# Altium footprint library PcbLib1.PcbLib: 209 footprints (part 1 of 14)
Each footprint in its own frame and in the unit in brackets; x right, y up, seen from the top. Pads: shape width x height; smd on the part's side, far side on the other; paste and mask are expansions set on the pad; w line width, h text height; cw(c..) or ccw(c..) is an arc to the next point about the centre after c.
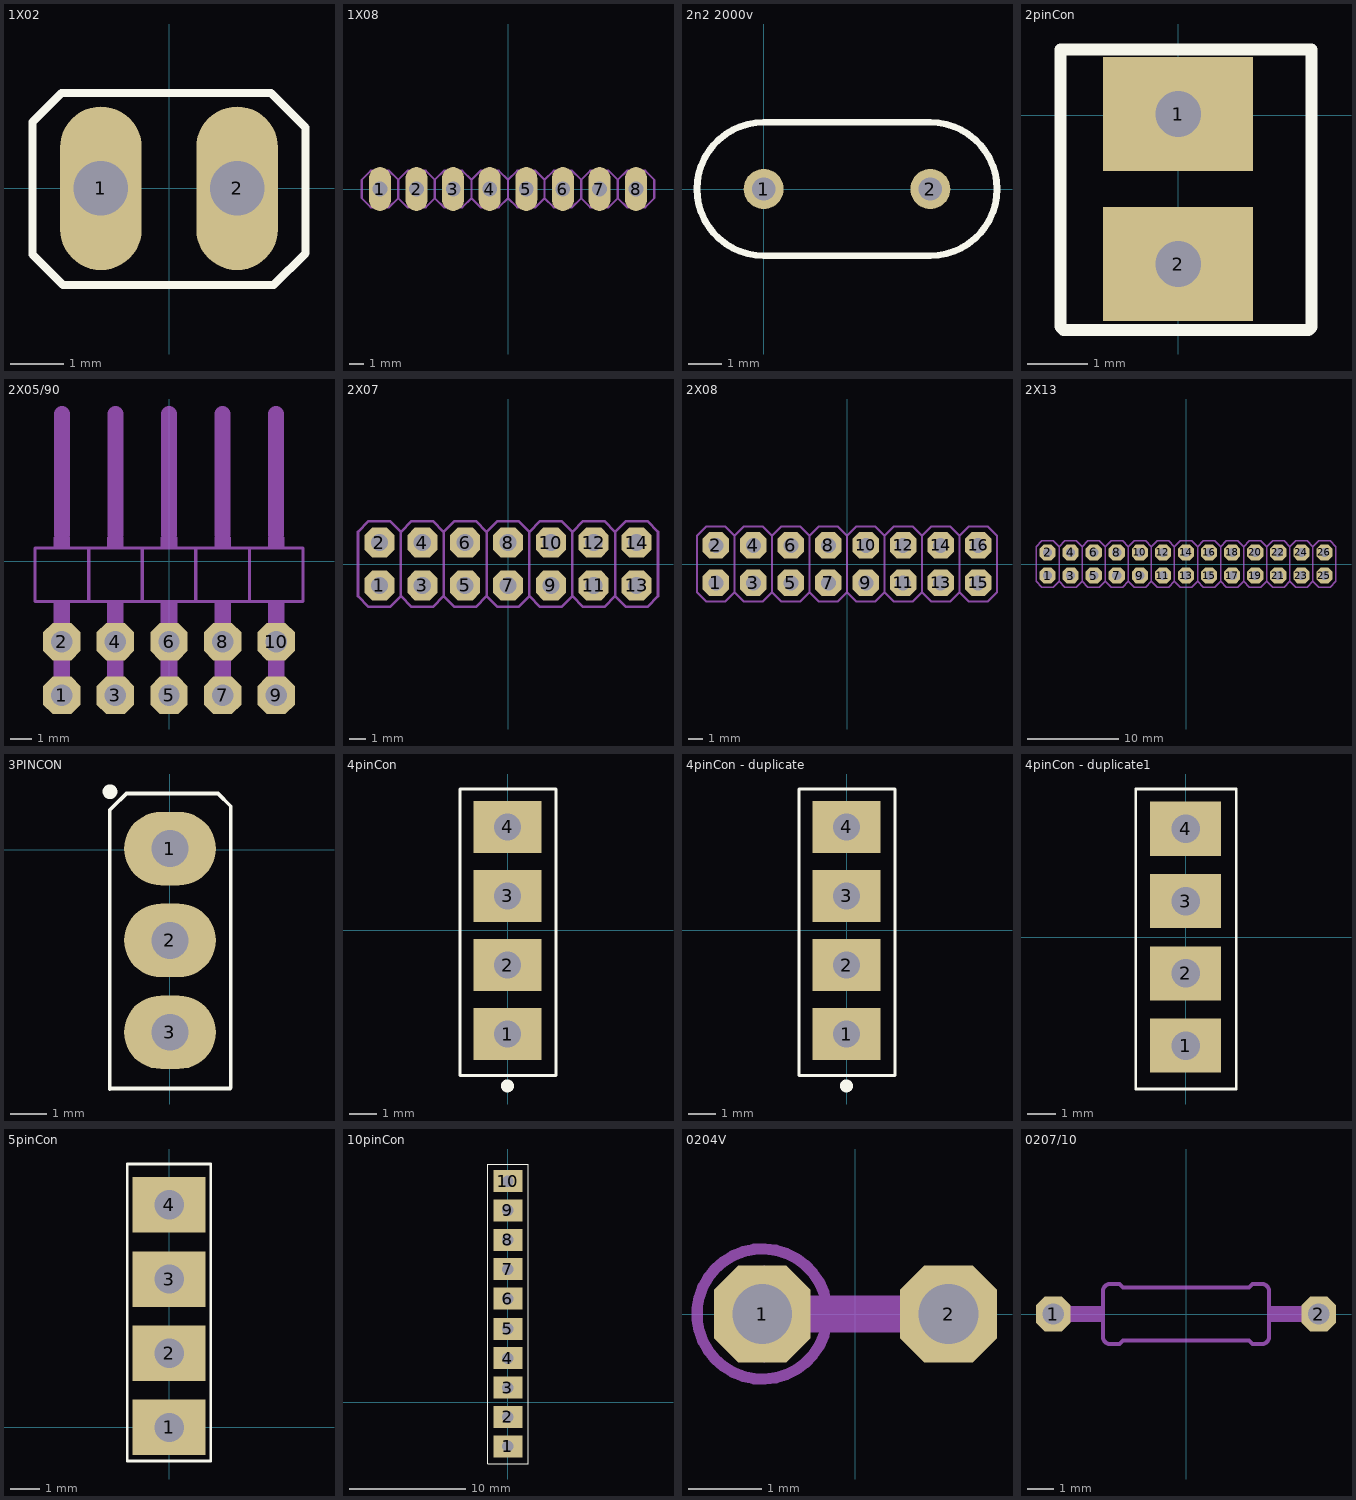
[diagram p0: the footprints below, top view; thin cyan lines are the x and y axes]

## 1X02 [mil] "1X02"
pads (2):
  oval 60x120 / inner round 0 / far side oval 60x120 hole 40: 1(-50,0) 2(50,0)
Top Overlay:
  lines w6: -100,-48.62 -100,48.62 -78.74,69.88 74.8,69.88 100,44.69 100,-47.64 76.77,-70.87 -65.94,-70.87 -77.76,-70.87 -100,-48.62
Bottom Assembly:
  region: -60,-10 -60,10 -40,10 -40,-10
  region: 40,-10 40,10 60,10 60,-10
3D body: height 150, standoff 0, extent -60,-10 -40,10
3D body: height 150, standoff 0, extent 40,-10 60,10
3D body: height 50, standoff 0, extent -80.26,-60.26 -19.74,60.26
3D body: height 50, standoff 0, extent 19.74,-60.26 80.26,60.26

## 1X08 [mil] "1X08"
pads (8):
  oval 60x120 / inner round 0 / far side oval 60x120 hole 40: 1(-350,0) 2(-250,0) 3(-150,0) 4(-50,0) 5(50,0) 6(150,0) 7(250,0) 8(350,0)
Bottom Assembly:
  region: 340,-10 340,10 360,10 360,-10
  region: -360,-10 -360,10 -340,10 -340,-10
  region: -260,-10 -260,10 -240,10 -240,-10
  region: -160,-10 -160,10 -140,10 -140,-10
  region: -60,-10 -60,10 -40,10 -40,-10
  region: 40,-10 40,10 60,10 60,-10
  region: 140,-10 140,10 160,10 160,-10
  region: 240,-10 240,10 260,10 260,-10
Bottom 3D Body:
  lines w6: -300,-25 -275,-50 -225,-50 -200,-25 ; -300,-25 -325,-50 -375,-50 -400,-25 -400,25 -375,50 -325,50 -300,25 ; -300,-25 -300,25 ; -300,25 -275,50 -225,50 -200,25 ; -200,-25 -200,25 ; -200,-25 -175,-50 -125,-50 -100,-25 ; -200,25 -175,50 -125,50 -100,25 ; -100,-25 -75,-50 -25,-50 0,-25 ; -100,-25 -100,25 ; -100,25 -75,50 -25,50 0,25 ; 0,-25 25,-50 75,-50 100,-25 ; 0,-25 0,25 ; 0,25 25,50 75,50 100,25 ; 100,-25 100,25 ; 100,-25 125,-50 175,-50 200,-25 ; 100,25 125,50 175,50 200,25 ; 200,-25 225,-50 275,-50 300,-25 ; 200,-25 200,25 ; 200,25 225,50 275,50 300,25 ; 300,-25 325,-50 375,-50 400,-25 400,25 375,50 325,50 300,25 ; 300,-25 300,25
3D body: height 50, standoff 0, extent 319.74,-60.26 380.26,60.26
3D body: height 50, standoff 0, extent 219.74,-60.26 280.26,60.26
3D body: height 50, standoff 0, extent 119.74,-60.26 180.26,60.26
3D body: height 50, standoff 0, extent 19.74,-60.26 80.26,60.26
3D body: height 50, standoff 0, extent -80.26,-60.26 -19.74,60.26
3D body: height 50, standoff 0, extent -180.26,-60.26 -119.74,60.26
3D body: height 50, standoff 0, extent -280.26,-60.26 -219.74,60.26
3D body: height 50, standoff 0, extent -380.26,-60.26 -319.74,60.26
3D body: height 150, standoff 0, extent 340,-10 360,10
3D body: height 150, standoff 0, extent -360,-10 -340,10
3D body: height 150, standoff 0, extent -260,-10 -240,10
3D body: height 150, standoff 0, extent -160,-10 -140,10
3D body: height 150, standoff 0, extent -60,-10 -40,10
3D body: height 150, standoff 0, extent 40,-10 60,10
3D body: height 150, standoff 0, extent 140,-10 160,10
3D body: height 150, standoff 0, extent 240,-10 260,10

## 2n2 2000v [mm]
pads (2):
  round 1.2 hole 0.7: 1(0,0) 2(5,0)
Top Overlay:
  lines w0.2: 0,-2 cw(c0,0) 0,2 5,2 cw(c5,0) 5,-2 0,-2
3D body "User Library-TDK_CAP_CK45_.STEP": height 12.5, standoff -5, extent -3.046,-2.475 7.947,2.525

## 2pinCon [mm]
pads (2):
  rect 2.5x1.9 hole 0.762 square: 1(0,0.025) 2(0,-2.475)
Top Overlay:
  lines w0.2: -1.965,-3.52 -1.91,-3.575 2.175,-3.575 2.225,-3.525 2.225,1.1 -1.965,1.1 -1.965,-3.52
3D body "User Library-Molex - 2-Pin Header with Lock (0_100in pitch).STEP": height 10.68, standoff -3.54, extent -3.302,-3.81 3.048,1.27

## 2X05/90 [mil] "2X05/90"
pads (10):
  oct 70x70 / inner round 0 / far side oct 70x70 hole 40: 1(-200,-250) 2(-200,-150) 3(-100,-250) 4(-100,-150) 5(0,-250) 6(0,-150) 7(100,-250) 8(100,-150) 9(200,-250) 10(200,-150)
Bottom Assembly:
  region: -215,-185 -215,-115 -185,-115 -185,-185
  region: -115,-185 -115,-115 -85,-115 -85,-185
  region: -15,-185 -15,-115 15,-115 15,-185
  region: 85,-185 85,-115 115,-115 115,-185
  region: 185,-185 185,-115 215,-115 215,-185
Bottom 3D Body:
  region: -215,25 -215,45 -185,45 -185,25
  region: -115,25 -115,45 -85,45 -85,25
  region: -15,25 -15,45 15,45 15,25
  region: 85,25 85,45 115,45 115,25
  region: 185,25 185,45 215,45 215,25
  region: -215,-115 -215,-75 -185,-75 -185,-115
  region: -115,-115 -115,-75 -85,-75 -85,-115
  region: -215,-215 -215,-185 -185,-185 -185,-215
  region: -115,-215 -115,-185 -85,-185 -85,-215
  region: -15,-115 -15,-75 15,-75 15,-115
  region: 85,-115 85,-75 115,-75 115,-115
  region: -15,-215 -15,-185 15,-185 15,-215
  region: 85,-215 85,-185 115,-185 115,-215
  region: 185,-115 185,-75 215,-75 215,-115
  region: 185,-215 185,-185 215,-185 215,-215
  lines w6: -150,-75 -250,-75 -250,25 -150,25 ; -150,-75 -150,25 ; -150,-75 -50,-75 ; -150,25 -50,25 ; -50,-75 -50,25 ; -50,-75 50,-75 ; -50,25 50,25 ; 50,-75 50,25 ; 50,-75 150,-75 ; 50,25 150,25 ; 150,-75 150,25 ; 150,-75 250,-75 250,25 150,25
  lines w30: -200,50 -200,275 ; -100,50 -100,275 ; 0,50 0,275 ; 100,50 100,275 ; 200,50 200,275

## 2X07 [mil] "2X07"
pads (14):
  oct 70x70 / inner round 0 / far side oct 70x70 hole 40: 1(-300,-50) 2(-300,50) 3(-200,-50) 4(-200,50) 5(-100,-50) 6(-100,50) 7(0,-50) 8(0,50) 9(100,-50) 10(100,50) 11(200,-50) 12(200,50) 13(300,-50) 14(300,50)
Bottom Assembly:
  region: -310,-60 -310,-40 -290,-40 -290,-60
  region: -310,40 -310,60 -290,60 -290,40
  region: -210,40 -210,60 -190,60 -190,40
  region: -210,-60 -210,-40 -190,-40 -190,-60
  region: -110,40 -110,60 -90,60 -90,40
  region: -110,-60 -110,-40 -90,-40 -90,-60
  region: -10,40 -10,60 10,60 10,40
  region: 90,40 90,60 110,60 110,40
  region: 190,40 190,60 210,60 210,40
  region: -10,-60 -10,-40 10,-40 10,-60
  region: 90,-60 90,-40 110,-40 110,-60
  region: 190,-60 190,-40 210,-40 210,-60
  region: 290,40 290,60 310,60 310,40
  region: 290,-60 290,-40 310,-40 310,-60
Bottom 3D Body:
  lines w6: -250,-75 -275,-100 -325,-100 -350,-75 -350,75 -325,100 -275,100 -250,75 ; -250,-75 -225,-100 -175,-100 -150,-75 ; -250,-75 -250,75 ; -250,75 -225,100 -175,100 -150,75 ; -150,-75 -125,-100 -75,-100 -50,-75 ; -150,-75 -150,75 ; -150,75 -125,100 -75,100 -50,75 ; -50,-75 -25,-100 25,-100 50,-75 ; -50,-75 -50,75 ; -50,75 -25,100 25,100 50,75 ; 50,-75 75,-100 125,-100 150,-75 ; 50,-75 50,75 ; 50,75 75,100 125,100 150,75 ; 150,-75 175,-100 225,-100 250,-75 ; 150,-75 150,75 ; 150,75 175,100 225,100 250,75 ; 250,-75 250,75 ; 250,-75 275,-100 325,-100 350,-75 350,75 325,100 275,100 250,75

## 2X08 [mil] "2X08"
pads (16):
  oct 70x70 / inner round 0 / far side oct 70x70 hole 40: 1(-350,-50) 2(-350,50) 3(-250,-50) 4(-250,50) 5(-150,-50) 6(-150,50) 7(-50,-50) 8(-50,50) 9(50,-50) 10(50,50) 11(150,-50) 12(150,50) 13(250,-50) 14(250,50) 15(350,-50) 16(350,50)
Bottom Assembly:
  region: -360,-60 -360,-40 -340,-40 -340,-60
  region: -360,40 -360,60 -340,60 -340,40
  region: -260,40 -260,60 -240,60 -240,40
  region: -260,-60 -260,-40 -240,-40 -240,-60
  region: -160,40 -160,60 -140,60 -140,40
  region: -160,-60 -160,-40 -140,-40 -140,-60
  region: -60,40 -60,60 -40,60 -40,40
  region: 40,40 40,60 60,60 60,40
  region: 140,40 140,60 160,60 160,40
  region: -60,-60 -60,-40 -40,-40 -40,-60
  region: 40,-60 40,-40 60,-40 60,-60
  region: 140,-60 140,-40 160,-40 160,-60
  region: 240,40 240,60 260,60 260,40
  region: 240,-60 240,-40 260,-40 260,-60
  region: 340,40 340,60 360,60 360,40
  region: 340,-60 340,-40 360,-40 360,-60
Bottom 3D Body:
  lines w6: -300,-75 -325,-100 -375,-100 -400,-75 -400,75 -375,100 -325,100 -300,75 ; -300,-75 -275,-100 -225,-100 -200,-75 ; -300,-75 -300,75 ; -300,75 -275,100 -225,100 -200,75 ; -200,-75 -175,-100 -125,-100 -100,-75 ; -200,-75 -200,75 ; -200,75 -175,100 -125,100 -100,75 ; -100,-75 -75,-100 -25,-100 0,-75 ; -100,-75 -100,75 ; -100,75 -75,100 -25,100 0,75 ; 0,-75 25,-100 75,-100 100,-75 ; 0,-75 0,75 ; 0,75 25,100 75,100 100,75 ; 100,-75 125,-100 175,-100 200,-75 ; 100,-75 100,75 ; 100,75 125,100 175,100 200,75 ; 200,-75 225,-100 275,-100 300,-75 ; 200,-75 200,75 ; 200,75 225,100 275,100 300,75 ; 300,-75 300,75 ; 300,-75 325,-100 375,-100 400,-75 400,75 375,100 325,100 300,75

## 2X13 [mil] "2X13"
pads (26):
  oct 70x70 / inner round 0 / far side oct 70x70 hole 40: 1(-600,-50) 2(-600,50) 3(-500,-50) 4(-500,50) 5(-400,-50) 6(-400,50) 7(-300,-50) 8(-300,50) 9(-200,-50) 10(-200,50) 11(-100,-50) 12(-100,50) 13(0,-50) 14(0,50) 15(100,-50) 16(100,50) 17(200,-50) 18(200,50) 19(300,-50) 20(300,50) 21(400,-50) 22(400,50) 23(500,-50) 24(500,50) 25(600,-50) 26(600,50)
Bottom 3D Body:
  drawing of 118 lines, arcs and shapes, not listed

## 3PINCON [mm]
pads (3):
  oval 2.5x2 hole 1: 1(0,0.025) 2(0,-2.475) 3(0,-4.975)
Top Overlay:
  circle w0.254: c-1.634,1.574 r0.074
  lines w0.1: -1.636,-6.519 -1.636,-4.604 -1.636,-0.774 -1.636,1.074 -1.569,1.141 -1.186,1.524 ; -1.636,-6.508 1.635,-6.508 1.655,-6.488 1.655,1.178 1.306,1.527 -1.183,1.527 -1.186,1.524 ; -1.156,1.524 -1.186,1.524
3D body "Pin Header 1x3 TH Pitch 2.54mm.stp": height 9.21, standoff -3.49, extent -1.27,-6.245 1.27,1.375

## 4pinCon [mm]
pads (4):
  rect 2.5x1.9 hole 1: 1(0,-3.81) 2(0,-1.27) 3(0,1.27) 4(0,3.81)
Top Overlay:
  circle w0.254: c-0.007,-5.72 r0.113
  lines w0.1: -1.75,-5.334 -1.75,5.207 1.778,5.207 1.778,-5.334 0.515,-5.334 -0.487,-5.334 -1.75,-5.334
3D body "User Library-SIP_header_2_54mm_4pin.STEP": height 4.94, standoff -2.26, extent -1.175,-4.953 1.397,5.207

## 4pinCon - duplicate [mm]
pads (4):
  rect 2.5x1.9 hole 1: 1(0,-3.81) 2(0,-1.27) 3(0,1.27) 4(0,3.81)
Top Overlay:
  circle w0.254: c-0.007,-5.72 r0.113
  lines w0.1: -1.75,-5.334 -0.487,-5.334 0.515,-5.334 1.778,-5.334 1.778,5.207 -1.75,5.207 -1.75,-5.334
3D body "User Library-SIP_header_2_54mm_4pin.STEP": height 4.94, standoff -2.26, extent -1.175,-4.953 1.397,5.207

## 4pinCon - duplicate1 [mm]
pads (4):
  rect 2.5x1.9 hole 1: 1(0,-3.81) 2(0,-1.27) 3(0,1.27) 4(0,3.81)
Top Overlay:
  lines w0.1: -1.75,-5.334 -1.75,5.207 1.778,5.207 1.778,-5.334 0.515,-5.334 -0.487,-5.334 -1.75,-5.334
3D body "User Library-Molex - 2-Pin Header with Lock (0_100in pitch).STEP": height 10.68, standoff -3.54, extent -3.175,0 3.175,5.08
3D body "User Library-Molex - 2-Pin Header with Lock (0_100in pitch).STEP": height 10.68, standoff -3.54, extent -3.175,-5.08 3.175,0

## 5pinCon [mm]
pads (4):
  rect 2.5x1.9 hole 1: 1(0,0) 2(0,2.54) 3(0,5.08) 4(0,7.62)
Top Overlay:
  lines w0.1: -1.436,-1.143 -0.741,-1.143 0.261,-1.143 1.423,-1.143 1.423,9.017 -1.436,9.017 -1.436,-1.143

## 10pinCon [mm]
pads (10):
  rect 2.5x1.9 hole 1: 1(0,-3.81) 2(0,-1.27) 3(0,1.27) 4(0,3.81) 5(0,6.35) 6(0,8.965) 7(0,11.505) 8(0,14.045) 9(0,16.585) 10(0,19.125)
Top Overlay:
  lines w0.1: -1.75,-5.334 -0.487,-5.334 0.515,-5.334 1.778,-5.334 1.778,20.6 -1.75,20.6 -1.75,-5.334

## 0204V [mil] "0204V"
pads (2):
  oct 52x52 / inner round 0 / far side oct 52x52 hole 32: 1(-50,0) 2(50,0)
Bottom Assembly:
  circle w6: c-50,0 r35
  circle w2: c-50,0 r25
  lines w20: -50,0 50,0
Bottom 3D Body:
  lines w20: -5,0 5,0
3D body: height 150, standoff 0, extent -60.2,-10.2 60.2,10.2
3D body: height 150, standoff 0, extent -88.33,-38.33 -11.67,38.33
3D body: height 150, standoff 0, extent -76.22,-26.22 -23.78,26.22
3D body: height 50, standoff 0, extent -74.49,-24.49 -25.51,24.49
3D body: height 50, standoff 0, extent 25.51,-24.49 74.49,24.49

## 0207/10 [mil] "0207/10"
pads (2):
  oct 52x52 / inner round 0 / far side oct 52x52 hole 32: 1(-200,0) 2(200,0)
Bottom Assembly:
  lines w24: -200,0 -160,0 ; 160,0 200,0
Bottom 3D Body:
  region: -159,-12 -159,12 -125,12 -125,-12
  region: 125,-12 125,12 159,12 159,-12
  lines w6: -125,-35 ccw(c-115,-35) -115,-45 -100,-45 -95,-40 95,-40 100,-45 115,-45 ccw(c115,-35) 125,-35 125,35 ccw(c115,35) 115,45 100,45 95,40 -95,40 -100,45 -115,45 ccw(c-115,35) -125,35 -125,-35
3D body: height 50, standoff 0, extent 175.51,-24.49 224.49,24.49
3D body: height 50, standoff 0, extent -224.49,-24.49 -175.51,24.49
3D body: height 150, standoff 0, extent -212.24,-12.24 -147.76,12.24
3D body: height 150, standoff 0, extent 147.76,-12.24 212.24,12.24